# Altium footprint library Dr.Xiong_20160818.PcbLib: 266 footprints (part 13 of 17)
Each footprint in its own frame and in the unit in brackets; x right, y up, seen from the top. Pads: shape width x height; smd on the part's side, far side on the other; paste and mask are expansions set on the pad; w line width, h text height; cw(c..) or ccw(c..) is an arc to the next point about the centre after c.
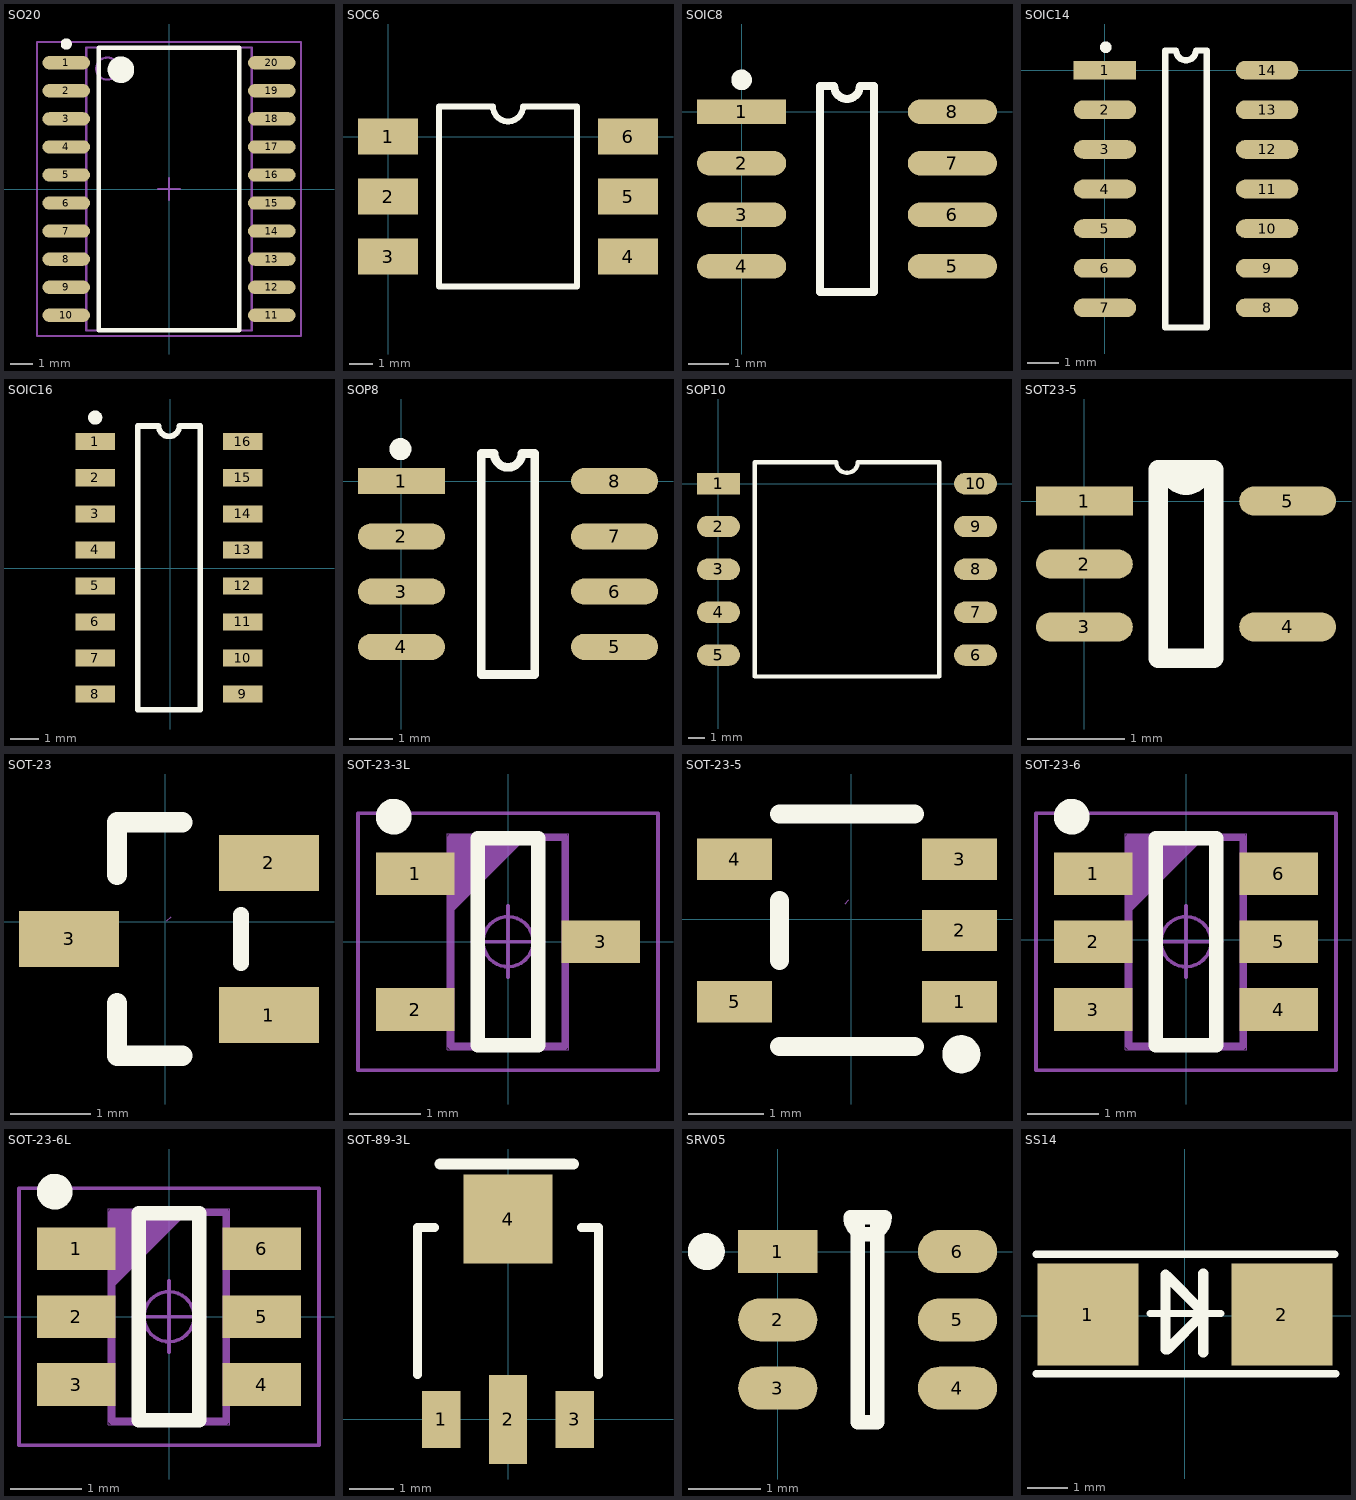
[diagram p12: the footprints below, top view; thin cyan lines are the x and y axes]

## SO20 [mm]
pads (20):
  oval 2.15x0.6 smd: 1(-4.65,5.715) 2(-4.65,4.445) 3(-4.65,3.175) 4(-4.65,1.905) 5(-4.65,0.635) 6(-4.65,-0.635) 7(-4.65,-1.905) 8(-4.65,-3.175) 9(-4.65,-4.445) 10(-4.65,-5.715) 11(4.65,-5.715) 12(4.65,-4.445) 13(4.65,-3.175) 14(4.65,-1.905) 15(4.65,-0.635) 16(4.65,0.635) 17(4.65,1.905) 18(4.65,3.175) 19(4.65,4.445) 20(4.65,5.715)
Top Overlay:
  circle w0.25: c-4.65,6.565 r0.125
  circle w0.6: c-2.175,5.4 r0.3
  lines w0.2: -3.175,-6.4 -3.175,6.4 3.175,6.4 3.175,-6.4 -3.175,-6.4
Mechanical 13:
  circle w0.1: c-2.8,5.45 r0.5
  lines w0.1: -3.75,-6.4 -3.75,6.4 3.75,6.4 3.75,-6.4 -3.75,-6.4
Mechanical 15:
  lines w0.1: -0.5,0 0.5,0 ; 0,-0.5 0,0.5 ; -5.975,-6.65 -5.975,6.65 5.975,6.65 5.975,-6.65 -5.975,-6.65
3D body: height 2.65, standoff 0.25, extent -3.75,-6.4 3.75,6.4

## SOC6 [mil]
pads (6):
  rect 100x60 smd: 1(0,0) 2(0,-100) 3(0,-200) 4(400,-200) 5(400,-100) 6(400,0)
Top Overlay:
  lines w10: 85,-250 315,-250 315,50 225,50 cw(c200,50) 175,50 85,50 85,-250

## SOIC8 [mm]
pads (8):
  rect 2.2x0.6 smd: 1(0,0)
  oval 2.2x0.6 smd: 2(0,-1.27) 3(0,-2.54) 4(0,-3.81) 5(5.2,-3.81) 6(5.2,-2.54) 7(5.2,-1.27) 8(5.2,0)
Top Overlay:
  circle w0.254: c0,0.787 r0.127
  lines w0.2: 1.935,-4.445 1.935,0.635 2.282,0.635 ccw(c2.6,0.635) 2.917,0.635 3.265,0.635 3.265,-4.445 1.935,-4.445

## SOIC14 [mm]
pads (14):
  rect 2x0.6 smd: 1(0,0)
  oval 2x0.6 smd: 2(0,-1.27) 3(0,-2.54) 4(0,-3.81) 5(0,-5.08) 6(0,-6.35) 7(0,-7.62) 8(5.2,-7.62) 9(5.2,-6.35) 10(5.2,-5.08) 11(5.2,-3.81) 12(5.2,-2.54) 13(5.2,-1.27) 14(5.2,0)
Top Overlay:
  circle w0.254: c0.025,0.737 r0.057
  lines w0.2: 1.935,-8.255 3.265,-8.255 3.265,0.635 2.917,0.635 cw(c2.6,0.635) 2.282,0.635 1.935,0.635 1.935,-8.255

## SOIC16 [mm]
pads (16):
  rect 1.4x0.6 smd: 1(-2.64,4.465) 2(-2.64,3.195) 3(-2.64,1.925) 4(-2.64,0.655) 5(-2.64,-0.615) 6(-2.64,-1.885) 7(-2.64,-3.155) 8(-2.64,-4.425) 9(2.56,-4.425) 10(2.56,-3.155) 11(2.56,-1.885) 12(2.56,-0.615) 13(2.56,0.655) 14(2.56,1.925) 15(2.56,3.195) 16(2.56,4.465)
Top Overlay:
  circle w0.25: c-2.64,5.315 r0.125
  lines w0.2: -1.14,-4.98 1.06,-4.98 1.06,5.02 0.327,5.02 cw(c-0.04,5.02) -0.407,5.02 -1.14,5.02 -1.14,-4.98

## SOP8 [mm]
pads (8):
  rect 2x0.6 smd: 1(0,0)
  oval 2x0.6 smd: 2(0,-1.27) 3(0,-2.54) 4(0,-3.81) 5(4.9,-3.81) 6(4.9,-2.54) 7(4.9,-1.27) 8(4.9,0)
Top Overlay:
  circle w0.254: c-0.025,0.737 r0.127
  lines w0.2: 1.835,-4.445 3.065,-4.445 3.065,0.635 2.768,0.635 cw(c2.45,0.635) 2.133,0.635 1.835,0.635 1.835,-4.445

## SOP10 [mm]
pads (10):
  rect 2.54x1.27 smd: 1(0,0)
  oval 2.54x1.27 smd: 2(0,-2.54) 3(0,-5.08) 4(0,-7.62) 5(0,-10.16) 6(15.24,-10.16) 7(15.24,-7.62) 8(15.24,-5.08) 9(15.24,-2.54) 10(15.24,0)
Top Overlay:
  lines w0.254: 2.159,-11.43 2.159,1.27 6.985,1.27 ccw(c7.62,1.27) 8.255,1.27 13.081,1.27 13.081,-11.43 2.159,-11.43

## SOT23-5 [mm]
pads (5):
  rect 1x0.3 smd: 1(0,0)
  oval 1x0.3 smd: 2(0,-0.65) 3(0,-1.3) 4(2.1,-1.3) 5(2.1,0)
Top Overlay:
  lines w0.2: 0.765,-1.625 1.335,-1.625 1.335,0.325 0.888,0.325 ccw(c1.05,0.325) 1.212,0.325 0.765,0.325 0.765,-1.625

## SOT-23 [mm]
pads (3):
  rect 1.25x0.7 smd: 1(1.296,-1.166) 2(1.296,0.734) 3(-1.204,-0.216)
Top Overlay:
  lines w0.2: 0.946,-0.516 0.946,0.084
  lines w0.254: -0.604,-1.017 -0.604,-1.676 0.211,-1.676 ; 0.211,1.244 -0.604,1.244 ; -0.604,0.584 -0.604,1.244 ; -0.604,0.584 -0.604,1.244 ; -0.604,0.584 -0.604,1.244
Mechanical 15:
  lines w0.003: 0.02,0.012 0.071,0.063

## SOT-23-3L [mm]
pads (3):
  rect 1.1x0.6 smd: 1(-1.3,0.95) 2(-1.3,-0.95) 3(1.3,0)
Top Overlay:
  circle w0.25: c-1.6,1.75 r0.125
  lines w0.2: -0.425,-1.45 -0.425,1.45 0.425,1.45 0.425,-1.45 -0.425,-1.45
Mechanical 1:
  lines w0.1: -0.8,0.46 0.2,1.46 ; -0.8,0.56 0.1,1.46 ; -0.8,0.66 0,1.46 ; -0.8,0.76 -0.1,1.46 ; -0.8,0.86 -0.2,1.46 ; -0.8,0.96 -0.3,1.46 ; -0.8,1.06 -0.4,1.46 ; -0.8,1.16 -0.5,1.46 ; -0.8,1.26 -0.6,1.46 ; -0.8,1.36 -0.7,1.46 ; -0.8,-1.46 -0.8,1.46 0.8,1.46 0.8,-1.46 -0.8,-1.46
  text "U1" at 0.36,-0.414 h0.6
Mechanical 16:
  circle w0.05: c0,0 r0.35
  lines w0.001: -0.85,-1.51 -0.85,1.51 0.85,1.51 0.85,-1.51 -0.85,-1.51
  lines w0.05: -0.5,0 0.5,0 ; 0,-0.5 0,0.5 ; -2.1,-1.8 -2.1,1.8 2.1,1.8 2.1,-1.8 -2.1,-1.8

## SOT-23-5 [mm]
pads (5):
  rect 1x0.55 smd: 1(1.443,-1.102) 2(1.443,-0.152) 3(1.443,0.798) 4(-1.557,0.798) 5(-1.557,-1.102)
Top Overlay:
  circle w0.254: c1.467,-1.803 r0.127
  lines w0.254: -0.957,-1.702 0.843,-1.702 ; -0.957,-0.552 -0.957,0.248 ; -0.957,1.398 0.843,1.398
Mechanical 15:
  lines w0.003: -0.083,0.203 -0.032,0.254

## SOT-23-6 [mm]
pads (6):
  rect 1.1x0.6 smd: 1(-1.3,0.925) 2(-1.3,-0.025) 3(-1.3,-0.975) 4(1.3,-0.975) 5(1.3,-0.025) 6(1.3,0.925)
Top Overlay:
  circle w0.25: c-1.6,1.725 r0.125
  lines w0.2: -0.425,-1.475 -0.425,1.425 0.425,1.425 0.425,-1.475 -0.425,-1.475
Mechanical 15:
  lines w0.1: -0.8,0.435 0.2,1.435 ; -0.8,0.535 0.1,1.435 ; -0.8,0.635 0,1.435 ; -0.8,0.735 -0.1,1.435 ; -0.8,0.835 -0.2,1.435 ; -0.8,0.935 -0.3,1.435 ; -0.8,1.035 -0.4,1.435 ; -0.8,1.135 -0.5,1.435 ; -0.8,1.235 -0.6,1.435 ; -0.8,1.335 -0.7,1.435 ; -0.8,-1.485 -0.8,1.435 0.8,1.435 0.8,-1.485 -0.8,-1.485
  text "1" at 0.45,-0.19 h0.75
Mechanical 16:
  circle w0.05: c0,-0.025 r0.35
  lines w0.001: -0.85,-1.535 -0.85,1.485 0.85,1.485 0.85,-1.535 -0.85,-1.535
  lines w0.05: -0.5,-0.025 0.5,-0.025 ; 0,-0.525 0,0.475 ; -2.1,-1.825 -2.1,1.775 2.1,1.775 2.1,-1.825 -2.1,-1.825

## SOT-23-6L [mm]
pads (6):
  rect 1.1x0.6 smd: 1(-1.3,0.95) 2(-1.3,0) 3(-1.3,-0.95) 4(1.3,-0.95) 5(1.3,0) 6(1.3,0.95)
Top Overlay:
  circle w0.25: c-1.6,1.75 r0.125
  lines w0.2: -0.425,-1.45 -0.425,1.45 0.425,1.45 0.425,-1.45 -0.425,-1.45
Mechanical 15:
  lines w0.1: -0.8,0.46 0.2,1.46 ; -0.8,0.56 0.1,1.46 ; -0.8,0.66 0,1.46 ; -0.8,0.76 -0.1,1.46 ; -0.8,0.86 -0.2,1.46 ; -0.8,0.96 -0.3,1.46 ; -0.8,1.06 -0.4,1.46 ; -0.8,1.16 -0.5,1.46 ; -0.8,1.26 -0.6,1.46 ; -0.8,1.36 -0.7,1.46 ; -0.8,-1.46 -0.8,1.46 0.8,1.46 0.8,-1.46 -0.8,-1.46
  text "1" at 0.45,-0.164 h0.75
Mechanical 16:
  circle w0.05: c0,0 r0.35
  lines w0.001: -0.85,-1.51 -0.85,1.51 0.85,1.51 0.85,-1.51 -0.85,-1.51
  lines w0.05: -0.5,0 0.5,0 ; 0,-0.5 0,0.5 ; -2.1,-1.8 -2.1,1.8 2.1,1.8 2.1,-1.8 -2.1,-1.8

## SOT-89-3L [mm]
pads (4):
  rect 0.864x1.27 smd: 1(-1.5,0) 3(1.5,0)
  rect 0.864x2 smd: 2(0,0)
  rect 2x2 smd: 4(0,4.5)
Top Overlay:
  lines w0.203: -2.032,1.016 -2.032,4.318 -1.651,4.318 ; 1.651,4.318 2.032,4.318 2.032,1.016
  lines w0.254: -1.524,5.74 1.473,5.74

## SRV05 [mm]
pads (6):
  rect 1.1x0.6 smd: 1(0,0)
  oval 1.1x0.6 smd: 2(0,-0.95) 3(0,-1.9) 4(2.5,-1.9) 5(2.5,-0.95) 6(2.5,0)
Top Overlay:
  circle w0.254: c-0.993,0 r0.13
  lines w0.2: 1.012,0.475 ccw(c1.25,0.475) 1.488,0.475 1.115,0.475 1.115,-2.375 1.385,-2.375 1.385,0.475 1.012,0.475

## SS14 [mil]
pads (2):
  rect 99.37x100 smd: 1(-95.06,1) 2(95.06,1)
Top Overlay:
  lines w7: -146,-57 148,-57 ; -146,60 147,60 ; -34,2 35,2
  lines w10: -19,-33 -19,40 ; -18,39 18,3 ; -17,-33 18,2 18,3 ; 18,-36 18,41 ; 18,1 18,3